# Altium footprint library Connectors.PcbLib: 245 footprints (part 15 of 16)
Each footprint in its own frame and in the unit in brackets; x right, y up, seen from the top. Pads: shape width x height; smd on the part's side, far side on the other; paste and mask are expansions set on the pad; w line width, h text height; cw(c..) or ccw(c..) is an arc to the next point about the centre after c.
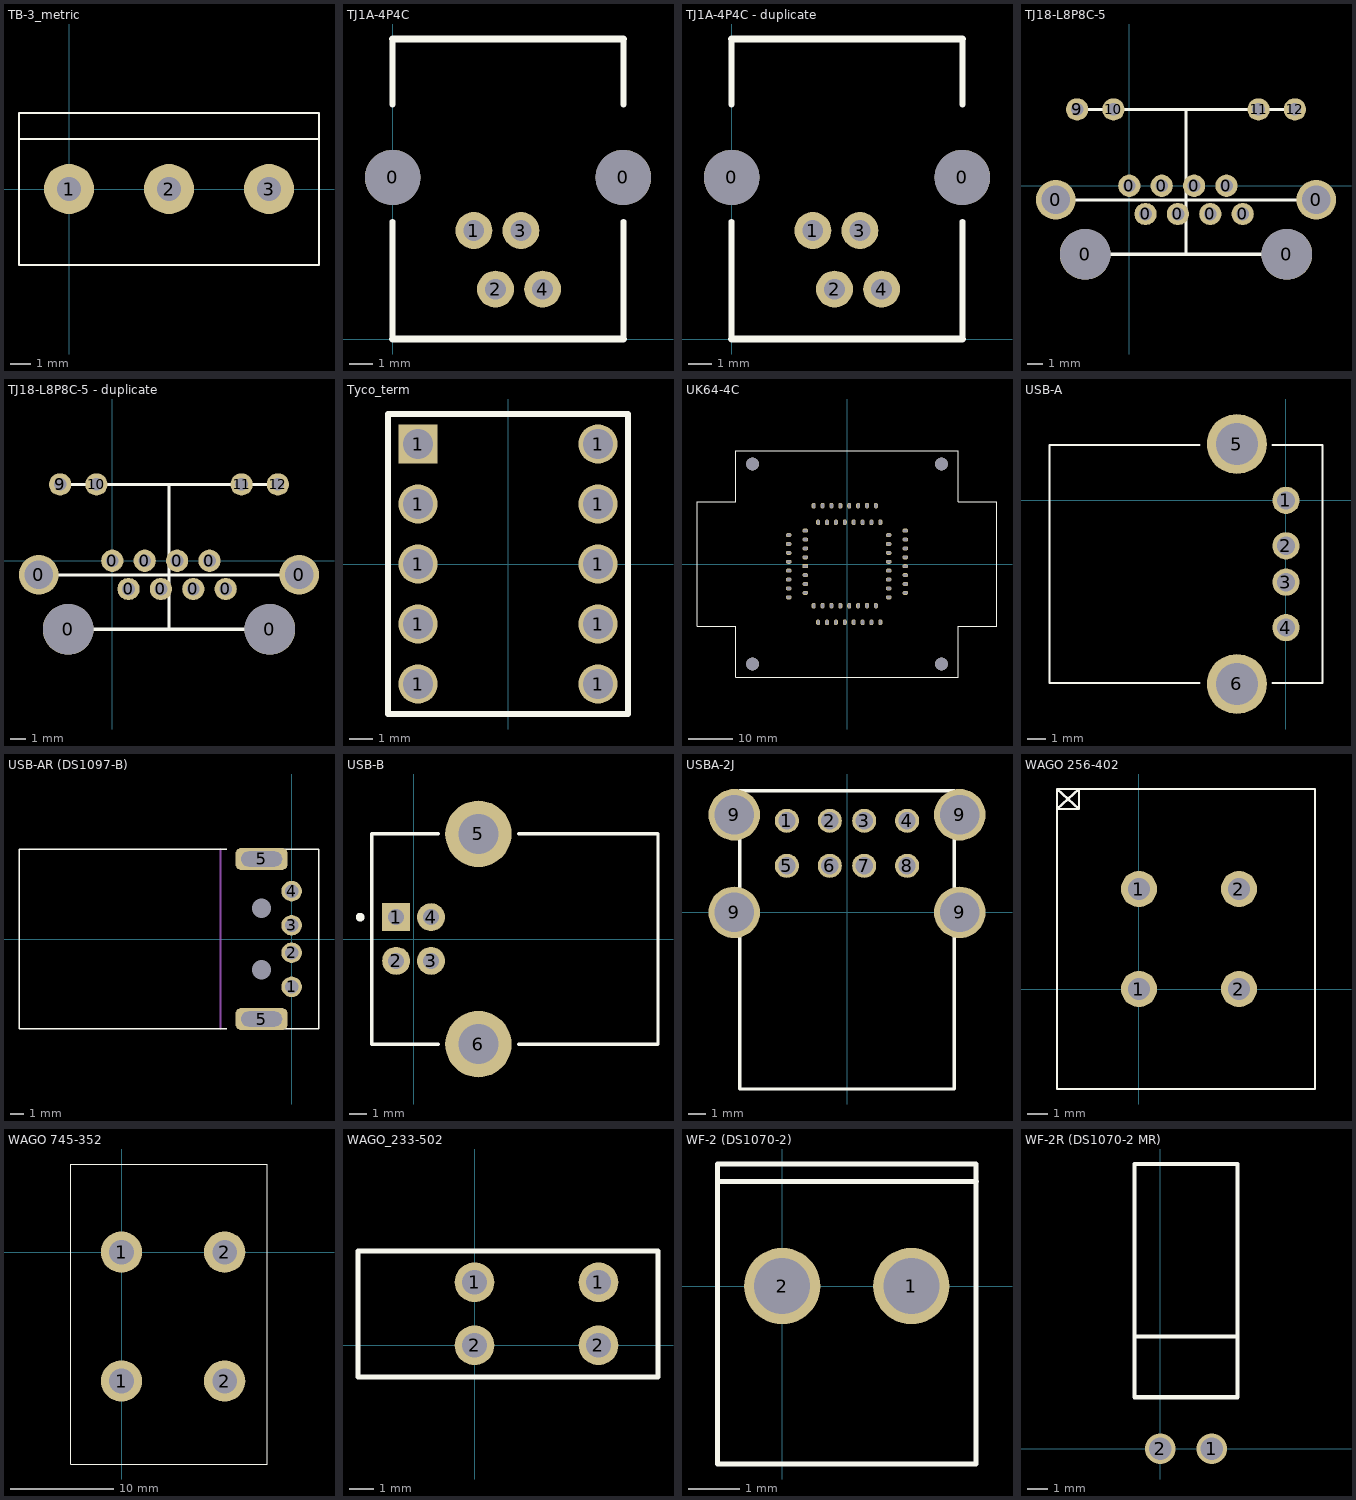
[diagram p14: the footprints below, top view; thin cyan lines are the x and y axes]

## TB-3_metric [mm] "Terminal block TB-3 metric (h=5.0mm)"
height 10.1
pads (3):
  round 2.5 hole 1.2: 1(0,0) 2(5,0) 3(10,0)
Top Overlay:
  lines w0.1: -2.5,2.5 12.5,2.5 ; -2.5,-3.8 -2.5,3.8 12.5,3.8 12.5,-3.8 -2.5,-3.8
3D body "TB-3_metric214.STEP": height 10.1, standoff -4, extent -2.504,-3.797 12.496,3.803

## TJ1A-4P4C [mm]
pads (6):
  round 2.4 hole 2.4: 0(0,7) 0(10,7)
  round 1.6 hole 0.9: 1(3.52,4.7) 2(4.46,2.16) 3(5.56,4.7) 4(6.5,2.16)
Top Overlay:
  lines w0.254: 0,0 0,5.08 ; 0,10.16 0,13 ; 10,0 10,5.08 ; 10,10.16 10,13
  lines w0.3: 0,0 10,0 ; 0,13 10,13

## TJ1A-4P4C - duplicate [mm]
pads (6):
  round 2.4 hole 2.4: 0(0,7) 0(10,7)
  round 1.6 hole 0.9: 1(3.52,4.7) 2(4.46,2.16) 3(5.56,4.7) 4(6.5,2.16)
Top Overlay:
  lines w0.254: 0,0 0,5.08 ; 0,10.16 0,13 ; 10,0 10,5.08 ; 10,10.16 10,13
  lines w0.3: 0,0 10,0 ; 0,13 10,13

## TJ18-L8P8C-5 [mm]
pads (16):
  round 2.5 hole 1.8: 0(-4.63,-0.89) 0(11.77,-0.89)
  round 3.2 hole 3.2: 0(-2.78,-4.32) 0(9.92,-4.32)
  round 1.4 hole 0.8: 0(0,0) 0(1.02,-1.78) 0(2.04,0) 0(3.06,-1.78) 0(4.08,0) 0(5.1,-1.78) 0(6.12,0) 0(7.14,-1.78) 9(-3.29,4.81) 10(-1,4.81) 11(8.14,4.81) 12(10.43,4.81)
Top Overlay:
  lines w0.2: -4.63,-0.89 3.57,-0.89 ; -3.29,4.81 3.57,4.81 ; -2.78,-4.32 3.57,-4.32 ; -1,4.81 3.57,4.81 ; 3.57,0 3.57,-0.89 ; 3.57,0.8 3.57,-2.58 ; 8.14,4.81 3.57,4.81 ; 9.92,-4.32 3.57,-4.32 ; 10.43,4.81 3.57,4.81 ; 11.77,-0.89 3.57,-0.89 ; 3.57,-4.32 3.57,-0.89 ; 3.57,-2.58 3.57,-2.58 ; 3.57,-0.89 3.57,4.81

## TJ18-L8P8C-5 - duplicate [mm]
pads (16):
  round 2.5 hole 1.8: 0(-4.63,-0.89) 0(11.77,-0.89)
  round 3.2 hole 3.2: 0(-2.78,-4.32) 0(9.92,-4.32)
  round 1.4 hole 0.8: 0(0,0) 0(1.02,-1.78) 0(2.04,0) 0(3.06,-1.78) 0(4.08,0) 0(5.1,-1.78) 0(6.12,0) 0(7.14,-1.78) 9(-3.29,4.81) 10(-1,4.81) 11(8.14,4.81) 12(10.43,4.81)
Top Overlay:
  lines w0.2: -4.63,-0.89 3.57,-0.89 ; -3.29,4.81 3.57,4.81 ; -2.78,-4.32 3.57,-4.32 ; -1,4.81 3.57,4.81 ; 3.57,0 3.57,-0.89 ; 3.57,0.8 3.57,-2.58 ; 8.14,4.81 3.57,4.81 ; 9.92,-4.32 3.57,-4.32 ; 10.43,4.81 3.57,4.81 ; 11.77,-0.89 3.57,-0.89 ; 3.57,-4.32 3.57,-0.89 ; 3.57,-2.58 3.57,-2.58 ; 3.57,-0.89 3.57,4.81

## Tyco_term [mil]
pads (10):
  round 65 hole 50: 1(-150,-200) 1(-150,-100) 1(-150,0) 1(-150,100) 1(150,-200) 1(150,-100) 1(150,0) 1(150,100) 1(150,200)
  rect 65x65 hole 50: 1(-150,200)
Top Overlay:
  lines w10: -200,-250 -200,250 200,250 200,-250 -200,-250
3D body "c-5055557-4-b-3d.stp": height 520, standoff -180, extent -224.99,-282.5 225,282.5

## UK64-4C [mm] "Контактное устройство для Н18.64"
pads (68):
  rect 1.3x0.9 hole 0.5 slot 0.9 at 0 deg: 1(-9.375,-0.5)
  oval 1.3x0.9 hole 0.5 slot 0.9 at 0 deg: 2(-13.125,-1.5) 3(-9.375,-2.5) 4(-13.125,-3.5) 5(-9.375,-4.5) 6(-13.125,-5.5) 7(-9.375,-6.5) 8(-13.125,-7.5) 25(9.375,-7.5) 26(13.125,-6.5) 27(9.375,-5.5) 28(13.125,-4.5) 29(9.375,-3.5) 30(13.125,-2.5) 31(9.375,-1.5) 32(13.125,-0.5) 33(9.375,0.5) 34(13.125,1.5) 35(9.375,2.5) 36(13.125,3.5) 37(9.375,4.5) 38(13.125,5.5) 39(9.375,6.5) 40(13.125,7.5) 57(-9.375,7.5) 58(-13.125,6.5) 59(-9.375,5.5) 60(-13.125,4.5) 61(-9.375,3.5) 62(-13.125,2.5) 63(-9.375,1.5) 64(-13.125,0.5)
  oval 0.9x1.3 hole 0.5 slot 0.9 at 90 deg: 9(-7.5,-9.375) 10(-6.5,-13.125) 11(-5.5,-9.375) 12(-4.5,-13.125) 13(-3.5,-9.375) 14(-2.5,-13.125) 15(-1.5,-9.375) 16(-0.5,-13.125) 17(0.5,-9.375) 18(1.5,-13.125) 19(2.5,-9.375) 20(3.5,-13.125) 21(4.5,-9.375) 22(5.5,-13.125) 23(6.5,-9.375) 24(7.5,-13.125) 41(7.5,9.375) 42(6.5,13.125) 43(5.5,9.375) 44(4.5,13.125) 45(3.5,9.375) 46(2.5,13.125) 47(1.5,9.375) 48(0.5,13.125) 49(-0.5,9.375) 50(-1.5,13.125) 51(-2.5,9.375) 52(-3.5,13.125) 53(-4.5,9.375) 54(-5.5,13.125) 55(-6.5,9.375) 56(-7.5,13.125)
  round 2.9 hole 2.9 unplated: ""(-21.25,-22.5) ""(-21.25,22.5) ""(21.25,-22.5) ""(21.25,22.5)
Top Overlay:
  lines w0.1: -33.75,-14 -25,-14 -25,-25.5 25,-25.5 25,-14 33.75,-14 33.75,14 25,14 25,25.5 -25,25.5 -25,14 -33.75,14 -33.75,-14
Bottom Overlay:
  text "2" at -14,-2 h1.52
  text "1" at -8,-1 h1.52
3D body: height 31, standoff 0, extent -25,-25.5 25,25.5
3D body: height 31, standoff 0, extent 25,-14 33.75,14
3D body: height 31, standoff 0, extent -33.75,-14 -25,14

## USB-A [mm]
height 7
pads (6):
  round 1.5 hole 1: 1(0,0) 2(0,-2.5) 3(0,-4.5) 4(0,-7)
  round 3.3 hole 2.3: 5(-2.7,3.1) 6(-2.7,-10.1)
Top Overlay:
  lines w0.1: -4.75,-10.05 -13,-10.05 -13,3.05 -4.75,3.05 ; -0.75,-10.05 2,-10.05 2,3.05 -0.75,3.05
3D body "14388.stp": height 8, standoff -2.85, extent -13.21,-11.4 1.29,4.4

## USB-AR (DS1097-B) [mm] "Вилка угловая на плату, тип А"
height 7
pads (8):
  round 1.5 hole 1: 1(0,-3.5) 2(0,-1) 3(0,1) 4(0,3.5)
  rrect50% 3.8x1.6 hole 1.1 slot 3 at 0 deg: 5(-2.2,-5.85) 5(-2.2,5.85)
  round 1 hole 1.4 unplated: ""(-2.2,-2.25) ""(-2.2,2.25)
Top Overlay:
  lines w0.1: -4.75,-6.55 -19.934,-6.55 -19.934,6.55 -4.75,6.55 ; -0.75,-6.55 2,-6.55 2,6.55 -0.75,6.55
Mechanical 1:
  lines w0.15: -5.2,-6.546 -5.2,6.542
  text "PCB EDGE" at -5.647,-3.371 h2
3D body "USB-A Right Angle Solder Plug.stp": height 3.4, standoff -2.62, extent -20.015,-6.343 0.02,6.353

## USB-B [mm] "Connector; USB1.1, Type B, Thru-Hole; 4 Position; Right Angle"
height 11.05
pads (6):
  rect 1.6x1.6 hole 0.92: 1(-1,1.25)
  round 1.6 hole 0.92: 2(-1,-1.25) 3(1,-1.25) 4(1,1.25)
  round 3.8 hole 2.3: 5(3.71,6.02) 6(3.71,-6.02)
Top Overlay:
  circle w0.25: c-3.06,1.25 r0.125
  lines w0.2: 1.41,-6.02 -2.41,-6.02 -2.41,6.02 1.41,6.02 ; 6.01,-6.02 13.99,-6.02 13.99,6.02 6.01,6.02
3D body "User Library-Samtec - USB-B-S-X-W-TH.STEP": height 10.7, standoff -3.94, extent -2.395,-7.4 14.105,7.398

## USBA-2J [mm]
pads (12):
  round 1.4 hole 1 unplated: 1(-3.5,5.33) 2(-1,5.33) 3(1,5.33) 4(3.5,5.33) 5(-3.5,2.71) 6(-1,2.71) 7(1,2.71) 8(3.5,2.71)
  round 3 hole 2.3 unplated: 9(-6.565,0) 9(-6.565,5.68) 9(6.565,0) 9(6.565,5.68)
Top Overlay:
  lines w0.2: -6.25,-10.28 -6.25,7.07 6.25,7.07 6.25,-10.28 -6.25,-10.28
3D body "5787745-1.STEP": height 16.15, standoff -3.99, extent -8.15,-10.28 8.109,6.9

## WAGO 256-402 [mm]
pads (4):
  round 1.8 hole 1.1: 1(0,0) 1(0,5) 2(5,0) 2(5,5)
Top Overlay:
  lines w0.1: -4.1,9 -3,10 -3,9 ; -4.1,9 -3,9 ; -4.1,9 -3,9 ; -4.1,10 -3,9 ; -4.1,10 -4.1,-5 8.8,-5 8.8,10 -4.1,10
3D body "User Library-WAGO256-401-256-100.STEP": height 18.81, standoff -4, extent 0.88,-5.029 8.78,10
3D body "User Library-WAGO256-401-256-100.STEP": height 18.81, standoff -4, extent -4.12,-5.029 3.78,10

## WAGO 745-352 [mm]
pads (4):
  round 4 hole 2.4: 1(0,-12.5) 1(0,0) 2(10,-12.5) 2(10,0)
Top Overlay:
  lines w0.1: -4.95,-20.55 -4.95,8.55 14.15,8.55 14.15,-20.55 -4.95,-20.55
3D body "745-352.stp": height 23, standoff -4.5, extent -4.95,-20.55 14.15,8.55

## WAGO_233-502 [mm]
pads (4):
  round 1.6 hole 1: 1(0,2.54) 1(5,2.54) 2(0,0) 2(5,0)
Top Overlay:
  lines w0.2: -4.7,-1.275 7.4,-1.275 7.4,0 7.4,3.8 -4.7,3.8 -4.7,-1.275
3D body "233-502.stp": height 16.44, standoff -4, extent -4.812,-2.16 7.512,5.22

## WF-2 (DS1070-2) [mm]
pads (2):
  round 1.5 hole 1.1: 1(2.534,-0.001) 2(-0.006,-0.001)
Top Overlay:
  lines w0.1: -1.252,2.057 3.813,2.057 ; -1.276,-3.5 3.804,-3.5 3.804,2.4 -1.276,2.4 -1.276,-3.5
3D body "User Library-DS1070-2 (WF-2 CONNFLY).STEP": height 11.4, standoff -3.3, extent -1.276,-3.5 3.804,2.4

## WF-2R (DS1070-2 MR) [mm]
pads (2):
  round 1.5 hole 1.1: 1(2.54,0) 2(0,0)
Top Overlay:
  lines w0.2: -1.26,11.5 -1.26,2.54 -1.26,14.04 3.8,14.04 3.8,11.49 3.8,2.54 ; -1.25,5.54 3.79,5.54 ; -1.23,2.54 3.79,2.54
3D body "User Library-WF-2R.step": height 5.8, standoff -3.4, extent -1.26,-0.33 3.82,12.87